# Altium footprint library Control_Board_Model.PcbLib: 160 footprints (part 6 of 10)
Each footprint in its own frame and in the unit in brackets; x right, y up, seen from the top. Pads: shape width x height; smd on the part's side, far side on the other; paste and mask are expansions set on the pad; w line width, h text height; cw(c..) or ccw(c..) is an arc to the next point about the centre after c.
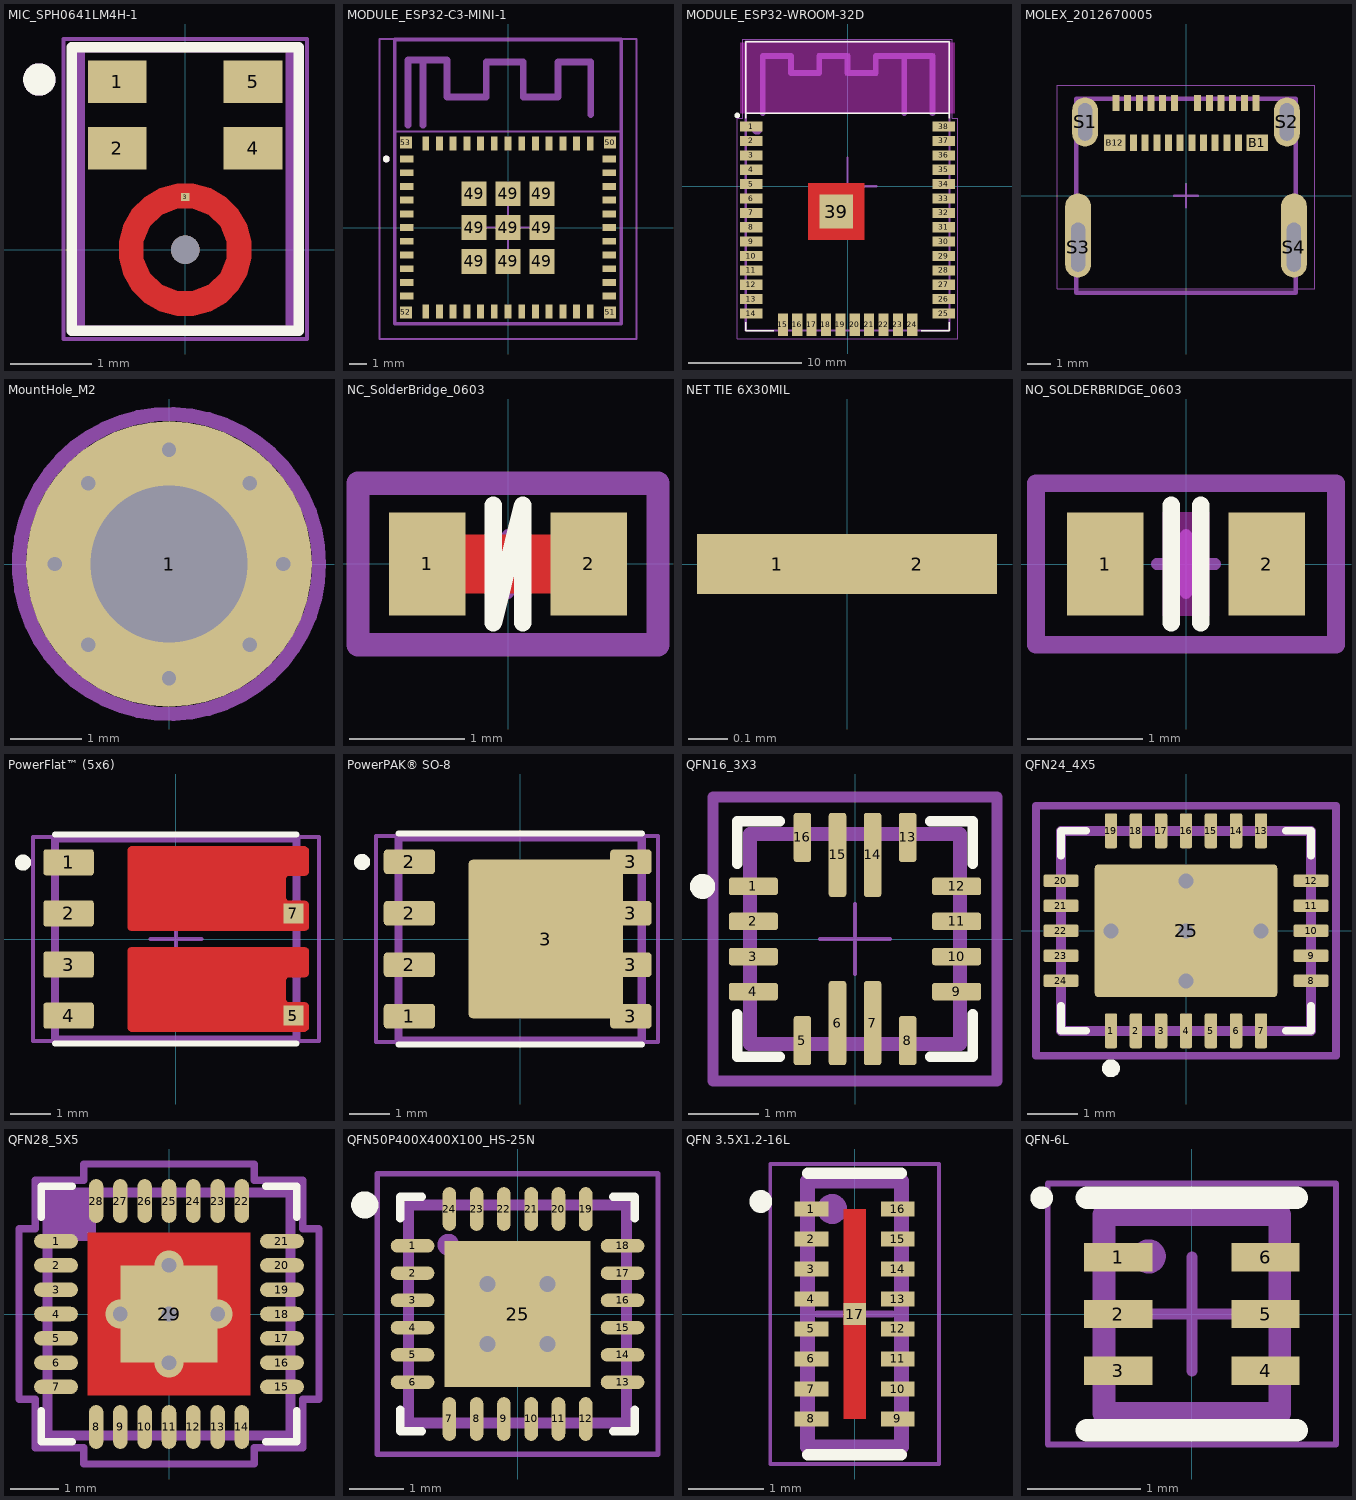
[diagram p5: the footprints below, top view; thin cyan lines are the x and y axes]

## MIC_SPH0641LM4H-1 [mm]
pads (6):
  rect 0.725x0.522 smd mask+0.05: 1(-0.837,2.074) 2(-0.837,1.252) 4(0.837,1.252) 5(0.837,2.074)
  rect 0.1x0.1 smd paste-1 mask+0: 3(0,0.65)
  round 0.35 hole 0.35 unplated mask+0.05: ""(0,0)
Top Layer:
  region: 0,0.812 -0.107,0.813 -0.314,0.757 -0.499,0.65 -0.65,0.499 -0.757,0.314 -0.813,0.107 -0.813,-0.107 -0.757,-0.314 -0.65,-0.499 -0.499,-0.65 -0.314,-0.757 -0.107,-0.813 0,-0.812 0,-0.512 -0.102,-0.505 -0.291,-0.431 -0.436,-0.289 -0.515,-0.102 -0.515,0.102 -0.436,0.289 -0.291,0.431 -0.102,0.505 0,0.512 0,0.513
  region: 0,0.812 0.107,0.813 0.314,0.757 0.499,0.65 0.65,0.499 0.757,0.314 0.813,0.107 0.813,-0.107 0.757,-0.314 0.65,-0.499 0.499,-0.65 0.314,-0.757 0.107,-0.813 0,-0.812 0,-0.512 0.102,-0.505 0.291,-0.431 0.436,-0.289 0.515,-0.102 0.515,0.102 0.436,0.289 0.291,0.431 0.102,0.505 0,0.512 0,0.513
Top Overlay:
  circle w0.2: c-1.8,2.1 r0.1
  lines w0.127: -1.4,-1 -1.4,2.5 1.4,2.5 1.4,-1 -1.4,-1
Top Paste:
  lines w0.3: -0.592,0.296 ccw(c0,0) -0.59,-0.3 ; -0.3,0.59 cw(c0,0) 0.296,0.592 ; -0.296,-0.592 ccw(c0,0) 0.3,-0.59 ; 0.59,0.3 cw(c0,0) 0.592,-0.296
Top Solder:
  region: 0,0.862 -0.114,0.863 -0.333,0.804 -0.53,0.69 -0.69,0.53 -0.804,0.333 -0.863,0.114 -0.863,-0.114 -0.804,-0.333 -0.69,-0.53 -0.53,-0.69 -0.333,-0.804 -0.114,-0.862 0,-0.862 0,-0.863 0,-0.462 -0.092,-0.456 -0.263,-0.389 -0.394,-0.261 -0.466,-0.092 -0.466,0.092 -0.394,0.261 -0.263,0.389 -0.092,0.456 0,0.462 0,0.463
  region: 0,-0.862 0.114,-0.863 0.333,-0.804 0.53,-0.69 0.69,-0.53 0.804,-0.333 0.863,-0.114 0.863,0.114 0.804,0.333 0.69,0.53 0.53,0.69 0.333,0.804 0.114,0.862 0,0.862 0,0.863 0,0.462 0.092,0.456 0.263,0.389 0.394,0.261 0.466,0.092 0.466,-0.092 0.394,-0.261 0.263,-0.389 0.092,-0.456 0,-0.462 0,-0.463
Mechanical 13:
  circle w0.2: c-1.8,2.1 r0.1
  lines w0.127: -1.3,-1 1.3,-1 1.3,2.5 -1.3,2.5 -1.3,-1
Mechanical 15:
  lines w0.05: -1.5,-1.1 1.5,-1.1 1.5,2.6 -1.5,2.6 -1.5,-1.1
3D body "IM69D130V01XTSA1--3DModel-STEP-56544.STEP": height 1.3, standoff 0, extent -1.5,-1.32 1.5,2.68

## MODULE_ESP32-C3-MINI-1 [mm]
height 2.4
pads (61):
  rect 0.8x0.4 smd: 1(-5.9,4) 2(-5.9,3.2) 3(-5.9,2.4) 4(-5.9,1.6) 5(-5.9,0.8) 6(-5.9,0) 7(-5.9,-0.8) 8(-5.9,-1.6) 9(-5.9,-2.4) 10(-5.9,-3.2) 11(-5.9,-4) 25(5.9,-4) 26(5.9,-3.2) 27(5.9,-2.4) 28(5.9,-1.6) 29(5.9,-0.8) 30(5.9,0) 31(5.9,0.8) 32(5.9,1.6) 33(5.9,2.4) 34(5.9,3.2) 35(5.9,4)
  rect 0.4x0.8 smd: 12(-4.8,-4.9) 13(-4,-4.9) 14(-3.2,-4.9) 15(-2.4,-4.9) 16(-1.6,-4.9) 17(-0.8,-4.9) 18(0,-4.9) 19(0.8,-4.9) 20(1.6,-4.9) 21(2.4,-4.9) 22(3.2,-4.9) 23(4,-4.9) 24(4.8,-4.9) 36(4.8,4.9) 37(4,4.9) 38(3.2,4.9) 39(2.4,4.9) 40(1.6,4.9) 41(0.8,4.9) 42(0,4.9) 43(-0.8,4.9) 44(-1.6,4.9) 45(-2.4,4.9) 46(-3.2,4.9) 47(-4,4.9) 48(-4.8,4.9)
  rect 1.45x1.45 smd: 49(-1.975,-1.975) 49(-1.975,0) 49(-1.975,1.975) 49(0,-1.975) 49(0,0) 49(0,1.975) 49(1.975,-1.975) 49(1.975,0) 49(1.975,1.975)
  rect 0.7x0.7 smd: 50(5.95,4.95) 51(5.95,-4.95) 52(-5.95,-4.95) 53(-5.95,4.95)
Top Overlay:
  circle w0.2: c-7.1,4 r0.1
Mechanical 14:
  circle w0.2: c-7.1,4 r0.1
  lines w0.2: -6.6,-5.6 -6.6,11 6.6,11 6.6,-5.6 -6.6,-5.6
Mechanical 15:
  lines w0.1: -1.27,0 1.27,0 ; 0,-1.27 0,1.27 ; -7.5,-6.5 -7.5,11 7.5,11 7.5,-6.5 -7.5,-6.5 ; -6.6,5.6 6.6,5.6 6.6,10.9 -6.6,10.9 -6.6,5.6
  lines w0.4: -5.842,5.969 -5.842,9.779 -5.715,9.779 -3.556,9.779 -3.556,7.62 -1.27,7.62 -1.27,9.652 -1.143,9.652 0.889,9.652 0.889,7.62 2.921,7.62 2.921,9.652 4.826,9.652 4.826,6.604 ; -4.953,5.969 -4.953,9.652
3D body: height 2.4, standoff 0.8, extent -5.975,-4.975 5.975,4.975
3D body: height 0.8, standoff 0, extent -6.6,-5.6 6.6,11

## MODULE_ESP32-WROOM-32D [mm]
pads (39):
  rect 2x0.9 smd: 1(-8.5,5.26) 2(-8.5,3.99) 3(-8.5,2.72) 4(-8.5,1.45) 5(-8.5,0.18) 6(-8.5,-1.09) 7(-8.5,-2.36) 8(-8.5,-3.63) 9(-8.5,-4.9) 10(-8.5,-6.17) 11(-8.5,-7.44) 12(-8.5,-8.71) 13(-8.5,-9.98) 14(-8.5,-11.25) 25(8.5,-11.25) 26(8.5,-9.98) 27(8.5,-8.71) 28(8.5,-7.44) 29(8.5,-6.17) 30(8.5,-4.9) 31(8.5,-3.63) 32(8.5,-2.36) 33(8.5,-1.09) 34(8.5,0.18) 35(8.5,1.45) 36(8.5,2.72) 37(8.5,3.99) 38(8.5,5.26)
  rect 0.9x2 smd: 15(-5.715,-12.25) 16(-4.445,-12.25) 17(-3.175,-12.25) 18(-1.905,-12.25) 19(-0.635,-12.25) 20(0.635,-12.25) 21(1.905,-12.25) 22(3.175,-12.25) 23(4.445,-12.25) 24(5.715,-12.25)
  rect 3x3 smd: 39(-1,-2.24)
Top Layer:
  rectangle: -3.5,-4.74 1.5,0.26
Top Overlay:
  circle w0.3: c-9.75,6.25 r0.1
  lines w0.127: -9,-12 -9,-12.75 -6.5,-12.75 ; -9,6 -9,12.75 9,12.75 9,6 ; -8.96,6.45 8.96,6.45 ; 6.5,-12.75 9,-12.75 9,-12
Top Paste:
  rectangle: -3.5,-4.74 1.5,0.26
  region: -2.584,-0.659 0.581,-0.659 0.581,-3.825 -2.584,-3.825
Top Solder:
  rectangle: -3.601,-4.841 1.602,0.361
Keep-Out Layer:
  rectangle: -9.5,6.4 9.5,12.7
Mechanical 14:
  circle w0.5: c-8,5 r0.2
  lines w0.152: -8.96,6.45 8.96,6.45
  lines w0.2: -9,-12.75 -9,12.75 9,12.75 9,-12.75 -9,-12.75
  lines w0.5: -7.5,6.45 -7.5,11.5 -5,11.5 -5,10 -2.5,10 -2.5,11.5 0,11.5 0,10 2.5,10 2.5,11.5 5,11.5 5,6.45 ; 3,11.5 7.5,11.5 7.5,6.45
  text ".Designator" at -1.3,-0.2 h0.5
Mechanical 15:
  lines w0.05: -9.75,-13.5 9.75,-13.5 9.75,6 9.25,6 9.25,13 -9.25,13 -9.25,6 -9.75,6 -9.75,-13.5
  lines w0.2: -2.54,0 2.54,0 ; 0,-2.54 0,2.54
3D body "ESP32-WROOM-32D--3DModel-STEP-56544.STEP": height 3.25, standoff 0, extent -9,-12.75 9,12.75

## MOLEX_2012670005 [mm] "USB-C (USB TYPE-C) USB 3.2 Gen 2 (USB 3.1 Gen 2, Superspeed + (USB 3.1)) Receptacle Connector 24 Position Surface Mount, Right Angle; Through Hole"
height 3.71
pads (28):
  rect 0.3x0.7 smd: A1(-3,3.97) A2(-2.5,3.97) A3(-2,3.97) A4(-1.5,3.97) A5(-1,3.97) A6(-0.5,3.97) A7(0.5,3.97) A8(1,3.97) A9(1.5,3.97) A10(2,3.97) A11(2.5,3.97) A12(3,3.97) B2(2.25,2.27) B3(1.75,2.27) B4(1.25,2.27) B5(0.75,2.27) B6(0.25,2.27) B7(-0.25,2.27) B8(-0.75,2.27) B9(-1.25,2.27) B10(-1.75,2.27) B11(-2.25,2.27)
  rect 0.9x0.7 smd: B1(3.05,2.27) B12(-3.05,2.27)
  oval 1.1x2.1 hole 0.6 slot 1.6 at 90 deg: S1(-4.32,3.16) S2(4.32,3.16)
  oval 1.1x3.6 hole 0.6 slot 2.1 at 90 deg copper offset 0,0.5: S3(-4.62,-2.2) S4(4.62,-2.2)
Mechanical 14:
  lines w0.2: -4.695,-4.15 4.695,-4.15 4.695,4.15 -4.695,4.15 -4.695,-4.15
  text "B1" at 3.11,1.09 h0.5
  text "B12" at -3.98,1.13 h0.5
  text "A12" at 2.69,4.55 h0.5
  text "A1" at -3.52,4.56 h0.5
  text "'.Designator'" at -0.78,-0.24 h0.5
Mechanical 15:
  lines w0.05: -5.5,-3.97 5.5,-3.97 5.5,4.73 -5.5,4.73 -5.5,-3.97
  lines w0.1: -0.5,0 0.5,0 ; 0,-0.5 0,0.5
3D body "2012670005.stp": height 3.72, standoff -2.29, extent -4.695,-4.15 4.695,4.15

## MountHole_M2 [mm] "Mount Hole M2"
height 0.025
pads (1):
  round 4 hole 2.2 paste-2 mask-2: 1(0,0)
via -1.131,1.131 diameter 0.55 hole 0.2
via 1.131,1.131 diameter 0.55 hole 0.2
via 1.131,-1.131 diameter 0.55 hole 0.2
via -1.131,-1.131 diameter 0.55 hole 0.2
via -1.6,0 diameter 0.55 hole 0.2
via 0,-1.6 diameter 0.55 hole 0.2
via 1.6,0 diameter 0.55 hole 0.2
via 0,1.6 diameter 0.55 hole 0.2
Top Solder:
  region: 0,2.1 0.207,2.1 0.613,2.019 0.995,1.861 1.339,1.631 1.631,1.339 1.861,0.995 2.019,0.613 2.1,0.207 2.1,0 2.1,-0.207 2.019,-0.613 1.861,-0.995 1.631,-1.339 1.339,-1.631 0.995,-1.861 0.613,-2.019 0.207,-2.1 0,-2.1 -0.207,-2.1 -0.612,-2.019 -0.995,-1.861 -1.339,-1.631 -1.631,-1.339 -1.861,-0.995 -2.019,-0.613 -2.1,-0.207 -2.1,0 -2.1,0.207 -2.019,0.613 -1.861,0.995 -1.631,1.339 -1.339,1.631 -0.995,1.861 -0.613,2.019 -0.207,2.1
Bottom Solder:
  region: 0,2.1 0.207,2.1 0.613,2.019 0.995,1.861 1.339,1.631 1.631,1.339 1.861,0.995 2.019,0.613 2.1,0.207 2.1,0 2.1,-0.207 2.019,-0.613 1.861,-0.995 1.631,-1.339 1.339,-1.631 0.995,-1.861 0.613,-2.019 0.207,-2.1 0,-2.1 -0.207,-2.1 -0.612,-2.019 -0.995,-1.861 -1.339,-1.631 -1.631,-1.339 -1.861,-0.995 -2.019,-0.613 -2.1,-0.207 -2.1,0 -2.1,0.207 -2.019,0.613 -1.861,0.995 -1.631,1.339 -1.339,1.631 -0.995,1.861 -0.613,2.019 -0.207,2.1
Mechanical 8:
  lines w0.2: -1,0 1,0 ; 0,-1 0,1
Mechanical 14:
  circle w0.2: c0,0 r2.1
  text "'.Designator'" at -0.381,-0.127 h0.5
Mechanical 15:
  lines w0.1: -1,0 1,0 ; 0,-1 0,1
3D body: height -0.09, standoff -0.1, extent -2,-2 2,2

## NC_SolderBridge_0603 [mil]
pads (2):
  rect 26x35 smd: 1(-27.56,0) 2(27.56,0)
Top Layer:
  rectangle: -16,-10 16,10
Top Overlay:
  lines w6: -5,20 -5,-20 5,20 5,-20
Mechanical 14:
  lines w7.87: -51.18,-27.56 51.18,-27.56 51.18,27.56 -51.18,27.56 -51.18,-27.56
  text ".Designator" at -39.37,-7.87 h19.68
Mechanical 15:
  lines w1.97: -51.18,-27.56 -51.18,27.56 51.18,27.56 51.18,-27.56 -51.18,-27.56
  lines w3.94: -10,0 10,0 ; 0,-10 0,10

## NET TIE 6X30MIL [mil]
pads (2):
  rect 16x6 smd paste-5 mask-5: 1(-7,0) 2(7,0)
Mechanical 15:
  lines w2: -5,0 5,0 ; 0,-1 0,1

## NO_SOLDERBRIDGE_0603 [mil]
pads (2):
  rect 26x35 smd: 1(-27.56,0) 2(27.56,0)
Top Layer keep-out:
  rectangle: -8,-17.72 8,17.72
Top Overlay:
  lines w6: -5,-20 -5,20 ; 5,-20 5,20
Top Solder:
  rectangle: -45.28,-21.65 45.28,21.65
Mechanical 14:
  lines w5.98: -51.18,-27.56 51.18,-27.56 51.18,27.56 -51.18,27.56 -51.18,-27.56
  text ".Designator" at -31.5,-7.87 h19.68
Mechanical 15:
  lines w1.97: -51.18,-27.56 -51.18,27.56 51.18,27.56 51.18,-27.56 -51.18,-27.56
  lines w3.94: -10,0 10,0 ; 0,-10 0,10

## PowerFlat™ (5x6) [mm]
pads (6):
  rrect20% 1.25x0.65 smd mask+0.05: 1(-2.667,1.905) 2(-2.667,0.635) 3(-2.667,-0.635) 4(-2.667,-1.905)
  rect 0.5x0.5 smd mask+0.05: 5(2.921,-1.905) 7(2.921,0.635)
Top Layer:
  region: -1.1,2.3 3.2,2.3 3.22,2.3 3.257,2.285 3.285,2.257 3.3,2.22 3.3,2.2 3.3,1.675 3.3,1.655 3.285,1.618 3.257,1.59 3.22,1.575 3.2,1.575 2.825,1.575 2.806,1.573 2.769,1.558 2.742,1.531 2.727,1.495 2.725,1.475 2.725,1.05 2.727,1.031 2.742,0.994 2.769,0.967 2.805,0.952 2.825,0.95 3.2,0.95 3.22,0.95 3.257,0.935 3.285,0.907 3.3,0.87 3.3,0.85 3.3,0.3 3.3,0.28 3.285,0.243 3.257,0.215 3.22,0.2 3.2,0.2 -1.1,0.2 -1.12,0.2 -1.157,0.215 -1.185,0.243 -1.2,0.28 -1.2,0.3 -1.2,2.2 -1.2,2.22 -1.185,2.257 -1.157,2.285 -1.12,2.3
  region: -1.1,-2.3 3.2,-2.3 3.22,-2.3 3.257,-2.285 3.285,-2.257 3.3,-2.22 3.3,-2.2 3.3,-1.675 3.3,-1.655 3.285,-1.618 3.257,-1.59 3.22,-1.575 3.2,-1.575 2.825,-1.575 2.805,-1.573 2.769,-1.558 2.742,-1.531 2.727,-1.495 2.725,-1.475 2.725,-1.05 2.727,-1.03 2.742,-0.994 2.769,-0.967 2.806,-0.952 2.825,-0.95 3.2,-0.95 3.22,-0.95 3.257,-0.935 3.285,-0.907 3.3,-0.87 3.3,-0.85 3.3,-0.3 3.3,-0.28 3.285,-0.243 3.257,-0.215 3.22,-0.2 3.2,-0.2 -1.1,-0.2 -1.12,-0.2 -1.157,-0.215 -1.185,-0.243 -1.2,-0.28 -1.2,-0.3 -1.2,-2.2 -1.2,-2.22 -1.185,-2.257 -1.157,-2.285 -1.12,-2.3
Top Overlay:
  circle w0.2: c-3.8,1.9 r0.1
  lines w0.152: -3,-2.6 3,-2.6 ; -3,2.6 3,2.6
Top Paste:
  region: 2.25,-0.9 3.25,-0.9 3.25,-0.25 2.25,-0.25
  region: 2.25,-2.25 3.25,-2.25 3.25,-1.625 2.25,-1.625
  region: -1.05,-0.3 -1.05,-2.2 -0.15,-2.2 -0.15,-0.3
  region: 0.05,-0.3 0.05,-2.2 0.95,-2.2 0.95,-0.3
  region: 1.15,-0.3 1.15,-2.2 2.05,-2.2 2.05,-0.3
  region: 1.15,2.2 1.15,0.3 2.05,0.3 2.05,2.2
  region: 0.05,2.2 0.05,0.3 0.95,0.3 0.95,2.2
  region: -1.05,2.2 -1.05,0.3 -0.15,0.3 -0.15,2.2
  region: 2.25,2.25 3.25,2.25 3.25,1.625 2.25,1.625
  region: 2.25,0.9 3.25,0.9 3.25,0.25 2.25,0.25
Top Solder:
  region: -1.15,-2.35 3.225,-2.35 3.25,-2.35 3.296,-2.331 3.331,-2.296 3.35,-2.25 3.35,-2.225 3.35,-1.65 3.35,-1.625 3.331,-1.579 3.296,-1.544 3.25,-1.525 3.225,-1.525 2.825,-1.525 2.815,-1.524 2.797,-1.517 2.783,-1.503 2.776,-1.485 2.775,-1.475 2.775,-1.05 2.776,-1.04 2.783,-1.022 2.797,-1.008 2.815,-1.001 2.825,-1 3.225,-1 3.25,-1 3.296,-0.981 3.331,-0.946 3.35,-0.9 3.35,-0.875 3.35,-0.275 3.35,-0.25 3.331,-0.204 3.296,-0.169 3.25,-0.15 3.225,-0.15 -1.15,-0.15 -1.17,-0.15 -1.207,-0.165 -1.235,-0.193 -1.25,-0.23 -1.25,-0.25 -1.25,-2.25 -1.25,-2.27 -1.235,-2.307 -1.207,-2.335 -1.17,-2.35
  region: -1.15,2.35 3.225,2.35 3.25,2.35 3.296,2.331 3.331,2.296 3.35,2.25 3.35,2.225 3.35,1.65 3.35,1.625 3.331,1.579 3.296,1.544 3.25,1.525 3.225,1.525 2.825,1.525 2.815,1.524 2.797,1.517 2.783,1.503 2.776,1.485 2.775,1.475 2.775,1.05 2.776,1.04 2.783,1.022 2.797,1.008 2.815,1.001 2.825,1 3.225,1 3.25,1 3.296,0.981 3.331,0.946 3.35,0.9 3.35,0.875 3.35,0.275 3.35,0.25 3.331,0.204 3.296,0.169 3.25,0.15 3.225,0.15 -1.15,0.15 -1.17,0.15 -1.207,0.165 -1.235,0.193 -1.25,0.23 -1.25,0.25 -1.25,2.25 -1.25,2.27 -1.235,2.307 -1.207,2.335 -1.17,2.35
Mechanical 14:
  circle w0.2: c-3,2 r0.1
  lines w0.2: -3,-2.5 -3,2.5 3,2.5 3,-2.5 -3,-2.5
  text ".Designator" at 0.127,-2.54 h0.5
Mechanical 15:
  lines w0.1: -0.635,0 0.635,0 ; 0,-0.635 0,0.635 ; -3.556,-2.54 3.556,-2.54 3.556,2.54 -3.556,2.54 -3.556,-2.54
3D body: height 0.8, standoff 0, extent -3,-2.5 3,2.5

## PowerPAK® SO-8 [mm]
pads (9):
  rrect30% 1.27x0.61 smd mask+0.07: 1(-2.73,-1.905) 2(-2.73,-0.635) 2(-2.73,0.635) 2(-2.73,1.905)
  rrect5% 3.81x3.91 smd paste-4 mask+0.07: 3(0.635,0)
  rrect30% 1.02x0.61 smd mask+0.07: 3(2.73,-1.905) 3(2.73,-0.635) 3(2.73,0.635) 3(2.73,1.905)
Top Overlay:
  circle w0.2: c-3.9,1.9 r0.1
  lines w0.152: -3,-2.6 3,-2.6 ; -3,2.6 3,2.6
Top Paste:
  region: -1.143,-1.587 -0.318,-1.587 -0.318,-0.318 -1.143,-0.318
  region: 0.762,-1.587 -0.064,-1.587 -0.064,-0.318 0.762,-0.318
  region: 1.905,-1.587 1.016,-1.587 1.016,-0.318 1.905,-0.318
  region: 1.905,1.587 1.016,1.587 1.016,0.318 1.905,0.318
  region: 0.762,1.587 -0.064,1.587 -0.064,0.318 0.762,0.318
  region: -1.143,1.587 -0.318,1.587 -0.318,0.318 -1.143,0.318
Mechanical 14:
  circle w0.2: c-3,2 r0.1
  lines w0.2: -3,-2.5 -3,2.5 3,2.5 3,-2.5 -3,-2.5
  text ".Designator" at 0.127,-2.54 h0.5
Mechanical 15:
  lines w0.1: -0.635,0 0.635,0 ; 0,-0.635 0,0.635 ; -3.556,-2.54 3.4,-2.54 3.4,2.54 -3.556,2.54 -3.556,-2.54
3D body "User Library-PowerPAK SO-8 (S).step": height 1.04, standoff 0, extent -3.075,-2.575 3.075,2.575

## QFN16_3X3 [mm]
pads (16):
  rrect30% 0.7x0.25 smd paste+0 mask+0.05: 1(-1.45,0.75) 2(-1.45,0.25) 3(-1.45,-0.25) 4(-1.45,-0.75) 9(1.45,-0.75) 10(1.45,-0.25) 11(1.45,0.25) 12(1.45,0.75)
  rrect30% 0.25x0.7 smd paste+0 mask+0.05: 5(-0.75,-1.45) 8(0.75,-1.45) 13(0.75,1.45) 16(-0.75,1.45)
  rrect30% 0.25x1.2 smd paste+0 mask+0.05: 6(-0.25,-1.2) 7(0.25,-1.2) 14(0.25,1.2) 15(-0.25,1.2)
Top Overlay:
  circle w0.2: c-2.175,0.75 r0.079
  lines w0.152: -1.679,-1.075 -1.679,-1.679 -1.075,-1.679 ; -1.679,1.075 -1.679,1.679 -1.075,1.679 ; 1.075,-1.679 1.679,-1.679 1.679,-1.075 ; 1.075,1.679 1.679,1.679 1.679,1.075
Mechanical 14:
  lines w0.2: -1.5,-1.5 -1.5,1.5 1.5,1.5 1.5,-1.5 -1.5,-1.5
  text "'.Designator'" at -2.6,-0.475 h0.5
Mechanical 15:
  lines w0.051: -0.5,0 0.5,0 ; 0,-0.5 0,0.5
  lines w0.152: -2.025,-2.025 -2.025,2.025 2.025,2.025 2.025,-2.025 -2.025,-2.025
3D body "User Library-QFN-16_3x3.STEP": height 0.9, standoff 0, extent -1.524,-1.521 1.518,1.521

## QFN24_4X5 [mm]
pads (25):
  rrect30% 0.25x0.7 smd paste+0 mask+0.05: 1(-1.5,-2) 2(-1,-2) 3(-0.5,-2) 4(0,-2) 5(0.5,-2) 6(1,-2) 7(1.5,-2) 13(1.5,2) 14(1,2) 15(0.5,2) 16(0,2) 17(-0.5,2) 18(-1,2) 19(-1.5,2)
  rrect30% 0.7x0.25 smd paste+0 mask+0.05: 8(2.5,-1) 9(2.5,-0.5) 10(2.5,0) 11(2.5,0.5) 12(2.5,1) 20(-2.5,1) 21(-2.5,0.5) 22(-2.5,0) 23(-2.5,-0.5) 24(-2.5,-1)
  rrect5% 3.65x2.65 smd paste-4 mask+0.05: 25(0,0)
via 0,-1 diameter 0.6 hole 0.3
via 1.5,0 diameter 0.6 hole 0.3
via -1.5,0 diameter 0.6 hole 0.3
via 0,1 diameter 0.6 hole 0.3
via 0,0 diameter 0.6 hole 0.3
Top Overlay:
  circle w0.2: c-1.5,-2.75 r0.079
  lines w0.152: -2.5,-1.5 -2.5,-2 -2,-2 ; -2.5,1.5 -2.5,2 -2,2 ; 2,-2 2.5,-2 2.5,-1.5 ; 2,2 2.5,2 2.5,1.5
Top Paste:
  region: 1.75,-0.25 0.25,-0.25 0.25,-1.25 1.75,-1.25
  rectangle: -1.75,-1.25 -0.25,-0.25
  region: 1.75,1.25 0.25,1.25 0.25,0.25 1.75,0.25
  rectangle: -1.75,0.25 -0.25,1.25
Mechanical 14:
  lines w0.2: -2.5,-2 2.5,-2 2.5,2 -2.5,2 -2.5,-2
  text "'.Designator'" at -2.75,-3.5 h0.5
Mechanical 15:
  lines w0.051: -0.5,0 0.5,0 ; 0,-0.5 0,0.5
  lines w0.152: -3,-2.5 3,-2.5 3,2.5 -3,2.5 -3,-2.5
3D body "User Library-QFN24_4x5x075.STEP": height 0.75, standoff -0.01, extent -2.51,-2.01 2.51,2.01

## QFN28_5X5 [mm]
pads (29):
  rrect100% 0.9x0.3 smd paste+0 mask+0.05: 1(-2.324,1.5) 2(-2.324,1) 3(-2.324,0.5) 4(-2.324,0) 5(-2.324,-0.5) 6(-2.324,-1) 7(-2.324,-1.5) 15(2.324,-1.5) 16(2.324,-1) 17(2.324,-0.5) 18(2.324,0) 19(2.324,0.5) 20(2.324,1) 21(2.324,1.5)
  rrect100% 0.3x0.9 smd paste+0 mask+0.05: 8(-1.5,-2.324) 9(-1,-2.324) 10(-0.5,-2.324) 11(0,-2.324) 12(0.5,-2.324) 13(1,-2.324) 14(1.5,-2.324) 22(1.5,2.324) 23(1,2.324) 24(0.5,2.324) 25(0,2.324) 26(-0.5,2.324) 27(-1,2.324) 28(-1.5,2.324)
  rect 2x2 smd paste-2 mask+0.05: 29(0,0)
via 0,-1 diameter 0.605 hole 0.3
via 0,1 diameter 0.605 hole 0.3
via 1,0 diameter 0.605 hole 0.3
via -1,0 diameter 0.605 hole 0.3
via 0,0 diameter 0.605 hole 0.3
Top Layer:
  rectangle: -1.675,-1.675 1.675,1.675
Top Overlay:
  lines w0.152: -2.629,-1.985 -2.629,-2.629 -1.985,-2.629 ; -2.629,1.985 -2.629,2.629 -1.985,2.629 ; 1.985,-2.629 2.629,-2.629 2.629,-1.985 ; 1.985,2.629 2.629,2.629 2.629,1.985
Top Paste:
  region: -0.1,1.525 -1.525,1.525 -1.525,0.1 -0.1,0.1
  region: -0.1,-0.1 -1.525,-0.1 -1.525,-1.525 -0.1,-1.525
  region: 1.525,1.525 0.1,1.525 0.1,0.1 1.525,0.1
  region: 1.525,-0.1 0.1,-0.1 0.1,-1.525 1.525,-1.525
Top Solder:
  rectangle: -1.725,-1.725 1.725,1.725
Mechanical 14:
  rectangle: -2.5,1.5 -1.5,2.5
  lines w0.2: -2.5,-2.5 -2.5,2.5 2.5,2.5 2.5,-2.5 -2.5,-2.5
  text "'.Designator'" at -0.5,-0.2 h0.5
Mechanical 15:
  lines w0.051: -0.5,0 0.5,0 ; 0,-0.5 0,0.5
  lines w0.152: -3.086,-1.75 -2.756,-1.75 -2.756,-2.756 -1.75,-2.756 -1.75,-3.086 1.75,-3.086 1.75,-2.756 2.756,-2.756 2.756,-1.75 3.086,-1.75 3.086,1.75 2.756,1.75 2.756,2.756 1.75,2.756 1.75,3.086 -1.75,3.086 -1.75,2.756 -2.756,2.756 -2.756,1.75 -3.086,1.75 -3.086,-1.75
3D body "QFN28_5X5.stp": height 0.94, standoff 0, extent -2.553,-2.553 2.553,2.553

## QFN50P400X400X100_HS-25N [mm] "QFN, 24-Leads, Body 4.00x4.00mm, Pitch 0.50mm, Thermal Pad 2.68x2.68mm, IPC Medium Density"
height 1
pads (25):
  oval 0.8x0.25 smd: 1(-1.925,1.25) 2(-1.925,0.75) 3(-1.925,0.25) 4(-1.925,-0.25) 5(-1.925,-0.75) 6(-1.925,-1.25) 13(1.925,-1.25) 14(1.925,-0.75) 15(1.925,-0.25) 16(1.925,0.25) 17(1.925,0.75) 18(1.925,1.25)
  oval 0.25x0.8 smd: 7(-1.25,-1.925) 8(-0.75,-1.925) 9(-0.25,-1.925) 10(0.25,-1.925) 11(0.75,-1.925) 12(1.25,-1.925) 19(1.25,1.925) 20(0.75,1.925) 21(0.25,1.925) 22(-0.25,1.925) 23(-0.75,1.925) 24(-1.25,1.925)
  rect 2.68x2.68 smd: 25(0,0)
via 0.55,-0.55 diameter 0.6 hole 0.3
via -0.55,-0.55 diameter 0.6 hole 0.3
via 0.55,0.55 diameter 0.6 hole 0.3
via -0.55,0.55 diameter 0.6 hole 0.3
Top Overlay:
  circle w0.25: c-2.8,2 r0.125
  lines w0.152: -2.15,-1.751 -2.15,-2.15 -1.751,-2.15 ; -2.15,1.751 -2.15,2.15 -1.751,2.15 ; 1.751,-2.15 2.15,-2.15 2.15,-1.751 ; 1.751,2.15 2.15,2.15 2.15,1.751
Mechanical 14:
  circle w0.2: c-1.27,1.27 r0.1
  lines w0.2: -2,-2 2,-2 2,2 -2,2 -2,-2
  text "'.Designator'" at -1,-0.2 h0.5
Mechanical 15:
  lines w0.1: -0.5,0 0.5,0 ; 0,-0.5 0,0.5 ; -2.575,-2.575 2.575,-2.575 2.575,2.575 -2.575,2.575 -2.575,-2.575
3D body "QFN50P400X400X100_HS-25N.step": height 1, standoff 0, extent -2.05,-2.05 2.05,2.05

## QFN 3.5X1.2-16L [mm] "Micro QFN 3.5x1.2-16L footprint"
height 0.5
pads (17):
  rect 0.45x0.2 smd mask+0.05: 1(-0.575,1.4) 2(-0.575,1) 3(-0.575,0.6) 4(-0.575,0.2) 5(-0.575,-0.2) 6(-0.575,-0.6) 7(-0.575,-1) 8(-0.575,-1.4) 9(0.575,-1.4) 10(0.575,-1) 11(0.575,-0.6) 12(0.575,-0.2) 13(0.575,0.2) 14(0.575,0.6) 15(0.575,1) 16(0.575,1.4)
  rect 0.3x0.3 smd mask+0.05: 17(0,0)
Top Layer:
  rectangle: -0.15,-1.4 0.15,1.4
Top Overlay:
  circle w0.152: c-1.25,1.5 r0.076
  lines w0.152: -0.625,-1.875 0.625,-1.875 ; -0.625,1.875 0.625,1.875
Top Paste:
  rectangle: -0.15,-1.4 0.15,1.4
Top Solder:
  rectangle: -0.2,-1.45 0.2,1.45
Mechanical 14:
  circle w0.2: c-0.3,1.4 r0.1
  lines w0.2: -0.625,-1.775 0.625,-1.775 0.625,1.775 -0.625,1.775 -0.625,-1.775
  text "'.Designator'" at -0.4,-0.3 h0.5
Mechanical 15:
  lines w0.051: -1.125,-2 -1.125,2 1.125,2 1.125,-2 -1.125,-2
  lines w0.1: -0.5,0 0.5,0 ; 0,-0.5 0,0.5
3D body "SON40P120X55_HS-17N.step": height 0.55, standoff 0.05, extent -0.625,-1.775 0.625,1.775

## QFN-6L [mm]
height 0.5
pads (6):
  rect 0.6x0.25 smd: 1(-0.65,0.5) 2(-0.65,0) 3(-0.65,-0.5) 4(0.65,-0.5) 5(0.65,0) 6(0.65,0.5)
Top Overlay:
  circle w0.1: c-1.325,1.025 r0.05
  lines w0.2: -0.925,-1.025 0.925,-1.025 ; -0.925,1.025 0.925,1.025
Mechanical 14:
  circle w0.2: c-0.381,0.508 r0.05
  lines w0.2: -0.775,-0.875 0.775,-0.875 0.775,0.875 -0.775,0.875 -0.775,-0.875
  text "'.Designator'" at -0.4,-0.3 h0.5
Mechanical 15:
  lines w0.05: -1.27,-1.15 1.27,-1.15 1.27,1.15 -1.27,1.15 -1.27,-1.15
  lines w0.1: -0.5,0 0.5,0 ; 0,-0.5 0,0.5
3D body "SON50P150X55-6N.step": height 0.55, standoff 0.05, extent -0.775,-0.875 0.775,0.875